# Altium footprint library TH Connectors.PcbLib: 140 footprints (part 8 of 9)
Each footprint in its own frame and in the unit in brackets; x right, y up, seen from the top. Pads: shape width x height; smd on the part's side, far side on the other; paste and mask are expansions set on the pad; w line width, h text height; cw(c..) or ccw(c..) is an arc to the next point about the centre after c.
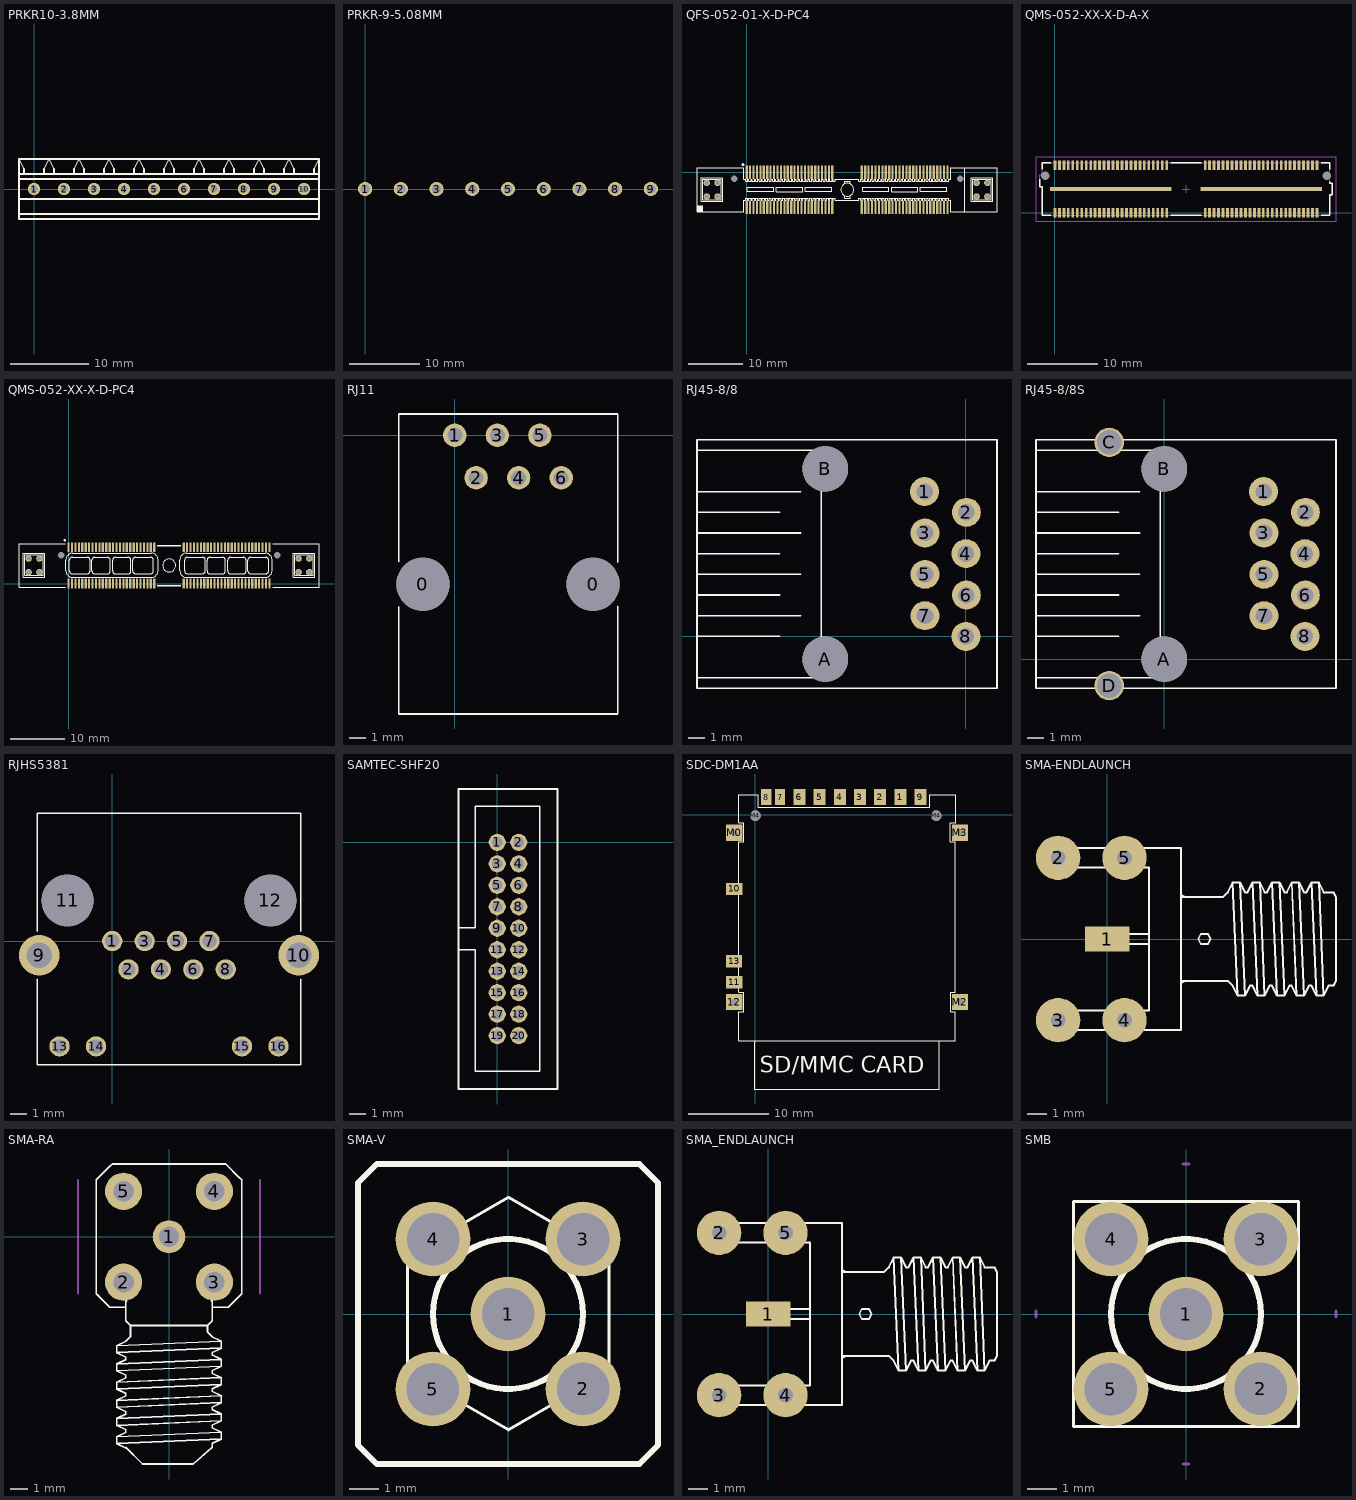
[diagram p7: the footprints below, top view; thin cyan lines are the x and y axes]

## PRKR10-3.8MM [mil]
pads (10):
  round 62 hole 35: 1(0,0) 2(150,0) 3(300,0) 4(450,0) 5(600,0) 6(750,0) 7(900,0) 8(1050,0) 9(1200,0) 10(1350,0)
Top Overlay:
  lines w8: -75,-125 1425,-125 ; -75,-50 1425,-50 ; -75,50 1425,50 ; -75,75 1425,75 ; -50,75 -50,100 -75,150 ; 50,75 50,100 75,150 100,100 100,75 ; 200,75 200,100 225,150 250,100 250,75 ; 350,75 350,100 375,150 400,100 400,75 ; 500,75 500,100 525,150 550,100 550,75 ; 650,75 650,100 675,150 700,100 700,75 ; 800,75 800,100 825,150 850,100 850,75 ; 950,75 950,100 975,150 1000,100 1000,75 ; 1100,75 1100,100 1125,150 1150,100 1150,75 ; 1250,75 1250,100 1275,150 1300,100 1300,75 ; 1400,75 1400,100 1425,150 ; -75,150 1425,150 ; -75,150 -75,-150 1425,-150 1425,150
3D body: height 349.65, standoff -122.8, extent -74,-144.4 1426,143

## PRKR-9-5.08MM [mil]
pads (9):
  round 80 hole 50 unplated mask+2: 1(0,0) 2(200,0) 3(400,0) 4(600,0) 5(800,0) 6(1000,0) 7(1200,0) 8(1400,0) 9(1600,0)
3D body: height 598.43, standoff -137.8, extent -100,-177.16 1719.69,177.16
3D body: height 0, standoff 0, extent -42,-42 1642,42

## QFS-052-01-X-D-PC4 [mm]
pads (114):
  rect 0.4x2.55 smd paste-0.508: 1(0,0) 2(0,-6.48) 3(0.635,0) 4(0.635,-6.48) 5(1.27,0) 6(1.27,-6.48) 7(1.905,0) 8(1.905,-6.48) 9(2.54,0) 10(2.54,-6.48) 11(3.175,0) 12(3.175,-6.48) 13(3.81,0) 14(3.81,-6.48) 15(4.445,0) 16(4.445,-6.48) 17(5.08,0) 18(5.08,-6.48) 19(5.715,0) 20(5.715,-6.48) 21(6.35,0) 22(6.35,-6.48) 23(6.985,0) 24(6.985,-6.48) 25(7.62,0) 26(7.62,-6.48) 27(8.255,0) 28(8.255,-6.48) 29(8.89,0) 30(8.89,-6.48) 31(9.525,0) 32(9.525,-6.48) 33(10.16,0) 34(10.16,-6.48) 35(10.795,0) 36(10.795,-6.48) 37(11.43,0) 38(11.43,-6.48) 39(12.065,0) 40(12.065,-6.48) 41(12.7,0) 42(12.7,-6.48) 43(13.335,0) 44(13.335,-6.48) 45(13.97,0) 46(13.97,-6.48) 47(14.605,0) 48(14.605,-6.48) 49(15.24,0) 50(15.24,-6.48) 51(15.875,0) 52(15.875,-6.48) 53(21.34,0) 54(21.34,-6.48) 55(21.975,0) 56(21.975,-6.48) 57(22.61,0) 58(22.61,-6.48) 59(23.245,0) 60(23.245,-6.48) 61(23.88,0) 62(23.88,-6.48) 63(24.515,0) 64(24.515,-6.48) 65(25.15,0) 66(25.15,-6.48) 67(25.785,0) 68(25.785,-6.48) 69(26.42,0) 70(26.42,-6.48) 71(27.055,0) 72(27.055,-6.48) 73(27.69,0) 74(27.69,-6.48) 75(28.325,0) 76(28.325,-6.48) 77(28.96,0) 78(28.96,-6.48) 79(29.595,0) 80(29.595,-6.48) 81(30.23,0) 82(30.23,-6.48) 83(30.865,0) 84(30.865,-6.48) 85(31.5,0) 86(31.5,-6.48) 87(32.135,0) 88(32.135,-6.48) 89(32.77,0) 90(32.77,-6.48) 91(33.405,0) 92(33.405,-6.48) 93(34.04,0) 94(34.04,-6.48) 95(34.675,0) 96(34.675,-6.48) 97(35.31,0) 98(35.31,-6.48) 99(35.945,0) 100(35.945,-6.48) 101(36.58,0) 102(36.58,-6.48) 103(37.215,0) 104(37.215,-6.48)
  round 1 hole 1.2 unplated paste-0.508: M1(39.56,-1.21) M2(-2.34,-1.21)
  round 1.2 hole 0.8 paste-0.508: P1(-7.4,-1.97) P2(-5.4,-1.97) P3(-7.4,-4.51) P4(-5.4,-4.51) P5(42.615,-1.97) P6(44.615,-1.97) P7(42.615,-4.51) P8(44.615,-4.51)
Top Overlay:
  drawing of 508 lines, arcs and shapes, not listed
3D body: height 8.85, standoff -1.77, extent -9.131,-7.316 46.418,0.813

## QMS-052-XX-X-D-A-X [mm]
pads (108):
  rect 0.4x1.4 smd: 1(0,0) 2(0,6.73) 3(0.635,0) 4(0.635,6.73) 5(1.27,0) 6(1.27,6.73) 7(1.905,0) 8(1.905,6.73) 9(2.54,0) 10(2.54,6.73) 11(3.175,0) 12(3.175,6.73) 13(3.81,0) 14(3.81,6.73) 15(4.445,0) 16(4.445,6.73) 17(5.08,0) 18(5.08,6.73) 19(5.715,0) 20(5.715,6.73) 21(6.35,0) 22(6.35,6.73) 23(6.985,0) 24(6.985,6.73) 25(7.62,0) 26(7.62,6.73) 27(8.255,0) 28(8.255,6.73) 29(8.89,0) 30(8.89,6.73) 31(9.525,0) 32(9.525,6.73) 33(10.16,0) 34(10.16,6.73) 35(10.795,0) 36(10.795,6.73) 37(11.43,0) 38(11.43,6.73) 39(12.065,0) 40(12.065,6.73) 41(12.7,0) 42(12.7,6.73) 43(13.335,0) 44(13.335,6.73) 45(13.97,0) 46(13.97,6.73) 47(14.605,0) 48(14.605,6.73) 49(15.24,0) 50(15.24,6.73) 51(15.875,0) 52(15.875,6.73) 53(21.34,0) 54(21.34,6.73) 55(21.975,0) 56(21.975,6.73) 57(22.61,0) 58(22.61,6.73) 59(23.245,0) 60(23.245,6.73) 61(23.88,0) 62(23.88,6.73) 63(24.515,0) 64(24.515,6.73) 65(25.15,0) 66(25.15,6.73) 67(25.785,0) 68(25.785,6.73) 69(26.42,0) 70(26.42,6.73) 71(27.055,0) 72(27.055,6.73) 73(27.69,0) 74(27.69,6.73) 75(28.325,0) 76(28.325,6.73) 77(28.96,0) 78(28.96,6.73) 79(29.595,0) 80(29.595,6.73) 81(30.23,0) 82(30.23,6.73) 83(30.865,0) 84(30.865,6.73) 85(31.5,0) 86(31.5,6.73) 87(32.135,0) 88(32.135,6.73) 89(32.77,0) 90(32.77,6.73) 91(33.405,0) 92(33.405,6.73) 93(34.04,0) 94(34.04,6.73) 95(34.675,0) 96(34.675,6.73) 97(35.31,0) 98(35.31,6.73) 99(35.945,0) 100(35.945,6.73) 101(36.58,0) 102(36.58,6.73) 103(37.215,0) 104(37.215,6.73)
  rect 17.25x0.5 smd: 105(7.94,3.365) 106(29.28,3.365)
  round 1 hole 1.2 unplated: 107(-1.395,5.275) 108(38.627,5.275)
Top Overlay:
  lines w0.2: -2.184,4.715 -2.184,3.715 -1.784,3.715 -1.784,-0.385 -0.584,-0.385 ; -1.784,6.165 -1.784,7.115 -0.584,7.115 ; 16.466,-0.385 20.766,-0.385 ; 16.466,7.115 20.766,7.115 ; 37.816,-0.385 39.016,-0.385 39.016,2.515 39.416,2.515 39.416,4.165 39.016,4.165 39.016,4.365 ; 37.816,7.115 39.016,7.115 39.016,6.165
Mechanical 12:
  lines w0.001: -2.184,3.715 -1.784,3.715 -1.784,-0.385 39.016,-0.385 39.016,2.515 39.416,2.515 39.416,4.165 39.016,4.165 39.016,7.115 -1.784,7.115 -1.784,5.365 -2.184,5.365 -2.184,3.715
Mechanical 13:
  lines w0.1: -2.184,3.715 -1.784,3.715 -1.784,-0.385 39.016,-0.385 39.016,2.515 39.416,2.515 39.416,4.165 39.016,4.165 39.016,7.115 -1.784,7.115 -1.784,5.365 -2.184,5.365 -2.184,3.715
Mechanical 15:
  lines w0.05: 18.116,3.365 19.116,3.365 ; 18.616,2.865 18.616,3.865 ; -2.684,-1.185 39.916,-1.185 39.916,7.915 -2.684,7.915 -2.684,-1.185

## QMS-052-XX-X-D-PC4 [mm]
pads (114):
  rect 0.4x1.8 smd: 1(0,0) 2(0,6.73) 3(0.635,0) 4(0.635,6.73) 5(1.27,0) 6(1.27,6.73) 7(1.905,0) 8(1.905,6.73) 9(2.54,0) 10(2.54,6.73) 11(3.175,0) 12(3.175,6.73) 13(3.81,0) 14(3.81,6.73) 15(4.445,0) 16(4.445,6.73) 17(5.08,0) 18(5.08,6.73) 19(5.715,0) 20(5.715,6.73) 21(6.35,0) 22(6.35,6.73) 23(6.985,0) 24(6.985,6.73) 25(7.62,0) 26(7.62,6.73) 27(8.255,0) 28(8.255,6.73) 29(8.89,0) 30(8.89,6.73) 31(9.525,0) 32(9.525,6.73) 33(10.16,0) 34(10.16,6.73) 35(10.795,0) 36(10.795,6.73) 37(11.43,0) 38(11.43,6.73) 39(12.065,0) 40(12.065,6.73) 41(12.7,0) 42(12.7,6.73) 43(13.335,0) 44(13.335,6.73) 45(13.97,0) 46(13.97,6.73) 47(14.605,0) 48(14.605,6.73) 49(15.24,0) 50(15.24,6.73) 51(15.875,0) 52(15.875,6.73) 53(21.34,0) 54(21.34,6.73) 55(21.975,0) 56(21.975,6.73) 57(22.61,0) 58(22.61,6.73) 59(23.245,0) 60(23.245,6.73) 61(23.88,0) 62(23.88,6.73) 63(24.515,0) 64(24.515,6.73) 65(25.15,0) 66(25.15,6.73) 67(25.785,0) 68(25.785,6.73) 69(26.42,0) 70(26.42,6.73) 71(27.055,0) 72(27.055,6.73) 73(27.69,0) 74(27.69,6.73) 75(28.325,0) 76(28.325,6.73) 77(28.96,0) 78(28.96,6.73) 79(29.595,0) 80(29.595,6.73) 81(30.23,0) 82(30.23,6.73) 83(30.865,0) 84(30.865,6.73) 85(31.5,0) 86(31.5,6.73) 87(32.135,0) 88(32.135,6.73) 89(32.77,0) 90(32.77,6.73) 91(33.405,0) 92(33.405,6.73) 93(34.04,0) 94(34.04,6.73) 95(34.675,0) 96(34.675,6.73) 97(35.31,0) 98(35.31,6.73) 99(35.945,0) 100(35.945,6.73) 101(36.58,0) 102(36.58,6.73) 103(37.215,0) 104(37.215,6.73)
  round 1 hole 1.2: 107(-1.395,5.275) 108(38.627,5.275)
  round 1.2 hole 0.8: P1(-7.4,4.63) P2(-5.4,4.63) P3(-7.4,2.09) P4(-5.4,2.09) P5(42.615,4.63) P6(44.615,4.63) P7(42.615,2.09) P8(44.615,2.09)
Top Overlay:
  drawing of 172 lines, arcs and shapes, not listed
3D body: height 6.58, standoff -2.82, extent -9.309,-0.406 46.571,7.112

## RJ11 [mil]
pads (8):
  round 125 hole 125 unplated: 0(-75,-350) 0(325,-350)
  round 55 hole 35: 1(0,0) 2(50,-100) 3(100,0) 4(150,-100) 5(200,0) 6(250,-100)
Top Overlay:
  lines w4: -132,-403 -132,-655 383,-655 383,-402 ; -132,-297 -132,50 383,50 383,-298

## RJ45-8/8 [mil]
pads (10):
  round 70 hole 40: 1(-100,350) 2(1,300) 3(-99,250) 4(0,200) 5(-99,150) 6(1,100) 7(-99,50) 8(0,0)
  round 110 hole 110 unplated: A(-340,-55) B(-340,405)
Top Overlay:
  lines w4: -650,-100 -400,-100 -350,-100 -350,450 -650,450 ; -650,0 -450,0 ; -650,50 -400,50 ; -650,100 -450,100 ; -650,150 -400,150 ; -650,200 -450,200 ; -650,250 -400,250 ; -650,300 -450,300 ; -650,350 -400,350 ; -100,475 75,475 ; 75,75 75,475 ; 75,475 75,-125 -650,-125 -650,475 75,475

## RJ45-8/8S [mil]
pads (12):
  round 70 hole 40: 1(240,405) 2(341,355) 3(241,305) 4(340,255) 5(241,205) 6(341,155) 7(241,105) 8(340,55)
  round 110 hole 110 unplated: A(0,0) B(0,460)
  round 70.87 hole 59.05: C(-133,524) D(-133,-64)
Top Overlay:
  lines w4: -310,-45 -60,-45 -10,-45 -10,505 -310,505 ; -310,55 -110,55 ; -310,105 -60,105 ; -310,155 -110,155 ; -310,205 -60,205 ; -310,255 -110,255 ; -310,305 -60,305 ; -310,355 -110,355 ; -310,405 -60,405 ; 240,530 415,530 ; 415,130 415,530 ; 415,530 -310,530 -310,-70 415,-70 415,530

## RJHS5381 [mil]
pads (16):
  round 50 hole 35: 1(0,0) 2(40,-70) 3(80,0) 4(120,-70) 5(160,0) 6(200,-70) 7(240,0) 8(280,-70) 13(-130,-260) 14(-40,-260) 15(320,-260) 16(410,-260)
  round 100 hole 62: 9(-180,-35) 10(460,-35)
  round 128 hole 128 unplated: 11(-110,100) 12(390,100)
Top Overlay:
  lines w4: -185,-94 -185,-305 465,-305 465,-94 ; -185,24 -185,315 465,315 465,24

## SAMTEC-SHF20 [mil]
pads (20):
  round 40 hole 25: 1(0,0) 2(50,0) 3(0,-50) 4(50,-50) 5(0,-100) 6(50,-100) 7(0,-150) 8(50,-150) 9(0,-200) 10(50,-200) 11(0,-250) 12(50,-250) 13(0,-300) 14(50,-300) 15(0,-350) 16(50,-350) 17(0,-400) 18(50,-400) 19(0,-450) 20(50,-450)
Top Overlay:
  lines w4: -89,-250 -51,-250 -51,-533 99,-533 99,84 -51,84 -51,-199 -88,-199 ; -90,-574 -90,-79 -90,124 0,124 140,124 140,-371 140,-574 50,-574 -90,-574

## SDC-DM1AA [mm]
pads (18):
  rect 1.5x2 smd: 1(17.995,2.224) 2(15.471,2.224) 3(12.972,2.224) 4(10.472,2.224) 5(7.973,2.224) 6(5.449,2.224) 9(20.47,2.224)
  rect 1.3x2 smd: 7(3.049,2.224) 8(1.325,2.224)
  rect 2x1.5 smd: 10(-2.624,-9.173) 11(-2.624,-20.745) 13(-2.649,-18.145)
  rect 2x2 hole 0.762: 12(-2.624,-23.219) M0(-2.624,-2.199) M2(25.368,-23.219) M3(25.368,-2.199)
  round 1.3 on Top hole 1.3 unplated: M4(0,-0.075) M4(22.419,-0.075)
Top Overlay:
  lines w0.102: -0.075,-27.993 -0.075,-33.991 16.546,-33.991 ; 6.198,-33.991 22.819,-33.991 22.819,-27.993 ; 20.895,-27.993 24.819,-27.993 24.819,-24.394 24.219,-24.394 24.219,-22.019 24.819,-22.019 24.819,-3.299 24.169,-3.299 24.169,-1.775 24.169,-0.95 24.394,-0.95 24.844,-0.95 24.844,2.524 21.594,2.524 21.594,0.975 0.325,0.975 0.325,2.524 -0.05,2.524 ; 21.12,-27.993 -2.074,-27.993 -2.074,-24.394 -1.475,-24.394 -1.475,-22.019 -2.074,-22.019 -2.074,-3.299 -1.425,-3.299 -1.425,-1.775 -1.425,-0.95 -1.65,-0.95 -2.099,-0.95 -2.099,2.524 ; -2.099,2.524 -0.05,2.524 ; -2.099,2.524 -0.05,2.524
  text "SD/MMC CARD" at 0.525,-31.967 h2.03

## SMA-ENDLAUNCH [mil]
pads (5):
  rect 90x50 smd: 1(0,0)
  round 90 hole 30: 2(-100,165) 3(-100,-165) 4(35,-165) 5(35,165)
Top Overlay:
  lines w4: 10,-10 85,-10 ; 10,10 85,10 ; 150,-90 160,-85 ; 150,-85 200,-85 220,-85 225,-85 235,-85 245,-85 255,-95 265,-115 ; 150,85 200,85 220,85 225,85 235,85 245,95 255,115 ; 150,90 160,85 ; 255,115 270,115 ; 255,115 265,-115 ; 265,-115 280,-115 ; 270,115 280,95 285,95 ; 270,115 280,-115 ; 280,-115 290,-95 ; 285,95 295,115 ; 285,95 295,115 ; 290,-95 295,-95 ; 290,-95 295,-95 ; 295,-95 305,-115 ; 295,115 310,115 ; 295,115 305,-115 ; 305,-115 320,-115 ; 310,115 320,95 325,95 335,115 ; 310,115 320,-115 ; 320,-115 330,-95 335,-95 345,-115 ; 335,115 350,115 ; 335,115 345,-115 ; 345,-115 360,-115 ; 350,115 360,95 365,95 375,115 ; 350,115 360,-115 ; 360,-115 370,-95 375,-95 385,-115 ; 375,115 390,115 ; 375,115 385,-115 ; 385,-115 400,-115 ; 390,115 400,95 405,95 415,115 ; 390,115 400,-115 ; 400,-115 410,-95 415,-95 425,-115 ; 415,115 430,115 ; 415,115 425,-115 ; 425,-115 440,-115 ; 430,115 440,95 448.33,95 460,95 465,85 465,53.33 465,-58.33 465,-85 460,-95 450,-95 440,-115 ; 430,115 440,-115 ; -100,-185 -100,-145 85,-145 85,145 -100,145 -100,185 65,185 85,185 150,185 150,-185 -100,-185 ; 185,0 190,10 205,10 210,0 205,-10 190,-10 185,0
3D body: height 140, standoff -110, extent -126.5,-120 470.5,130

## SMA-RA [mil]
pads (5):
  round 72 hole 45: 1(0,0)
  round 82 hole 45: 2(-100,-100) 3(100,-100) 4(100,100) 5(-100,100)
Top Overlay:
  lines w4: -155,-130 -160,-125 ; -95,-465 -115,-455 ; -95,-463.33 -58.33,-500 53.33,-500 95,-463.33 95,-455 115,-445 ; -95,-155 -130,-155 -160,-125 ; -93.33,-141.67 -95,-140 -95,-185 -85,-195 ; 93.33,-141.67 95,-140 95,-185 85,-195 ; 95,-155 130,-155 160,-125 160,80 ; 160,75 160,125 155,130 125,160 -125,160 -130,155 -160,125 -160,-125 ; -115,-455 -115,-440 ; -115,-455 115,-445 ; -115,-440 -95,-430 -95,-425 -115,-415 ; -115,-440 115,-430 ; -115,-415 -115,-400 ; -115,-415 115,-405 ; -115,-400 -95,-390 -95,-385 -115,-375 ; -115,-400 115,-390 ; -115,-375 -115,-360 ; -115,-375 115,-365 ; -115,-360 -95,-350 -95,-345 -115,-335 ; -115,-360 115,-350 ; -115,-335 -115,-320 ; -115,-335 115,-325 ; -115,-320 -95,-310 -95,-305 -115,-295 ; -115,-320 115,-310 ; -115,-295 -115,-280 ; -115,-295 115,-285 ; -115,-280 -95,-270 -95,-265 -115,-255 ; -115,-280 115,-270 ; -115,-255 -115,-240 ; -115,-255 115,-245 ; -115,-240 -95,-230 -85,-220 -85,-210 -85,-200 -85,-195 ; -115,-240 115,-230 ; -85,-195 85,-195 ; 85,-195 85,-200 85,-210 95,-220 115,-230 ; 115,-445 115,-430 ; 115,-430 95,-420 95,-415 115,-405 ; 115,-405 115,-390 ; 115,-390 95,-380 95,-375 115,-365 ; 115,-365 115,-350 ; 115,-350 95,-340 95,-335 115,-325 ; 115,-325 115,-310 ; 115,-310 95,-300 95,-295 115,-285 ; 115,-285 115,-270 ; 115,-270 95,-260 95,-255 115,-245 ; 115,-245 115,-230
Mechanical 1:
  lines w4: -200,-125 -200,125 ; 200,-125 200,125
3D body: height 394.06, standoff -149.25, extent -136.5,-457.49 139.09,137

## SMA-V [mil]
pads (5):
  round 100 hole 70: 1(0,0) 2(100,-100) 3(100,100) 4(-100,100) 5(-100,-100)
Top Overlay:
  circle w8: c0,0 r25
  circle w8: c0,0 r100
  lines w4: -133.69,-76.91 0.55,-154.41 134.78,-76.91 134.78,78.09 0.55,155.59 -133.69,78.09 -133.69,-76.91
  lines w8: -200,-175 -200,150 -200,175 -175,200 175,200 200,175 200,-175 175,-200 -175,-200 -200,-175
3D body: height 385.54, standoff -145.95, extent -138.3,-136.09 137.3,139.5

## SMA_ENDLAUNCH [mil]
pads (5):
  rect 90x50 smd: 1(0,0)
  round 90 hole 30: 2(-100,165) 3(-100,-165) 4(35,-165) 5(35,165)
Top Overlay:
  lines w4: 10,-10 85,-10 ; 10,10 85,10 ; 150,-90 160,-85 ; 150,-85 200,-85 220,-85 225,-85 235,-85 245,-85 255,-95 265,-115 ; 150,85 200,85 220,85 225,85 235,85 245,95 255,115 ; 150,90 160,85 ; 255,115 270,115 ; 255,115 265,-115 ; 265,-115 280,-115 ; 270,115 280,95 285,95 ; 270,115 280,-115 ; 280,-115 290,-95 ; 285,95 295,115 ; 285,95 295,115 ; 290,-95 295,-95 ; 290,-95 295,-95 ; 295,-95 305,-115 ; 295,115 310,115 ; 295,115 305,-115 ; 305,-115 320,-115 ; 310,115 320,95 325,95 335,115 ; 310,115 320,-115 ; 320,-115 330,-95 335,-95 345,-115 ; 335,115 350,115 ; 335,115 345,-115 ; 345,-115 360,-115 ; 350,115 360,95 365,95 375,115 ; 350,115 360,-115 ; 360,-115 370,-95 375,-95 385,-115 ; 375,115 390,115 ; 375,115 385,-115 ; 385,-115 400,-115 ; 390,115 400,95 405,95 415,115 ; 390,115 400,-115 ; 400,-115 410,-95 415,-95 425,-115 ; 415,115 430,115 ; 415,115 425,-115 ; 425,-115 440,-115 ; 430,115 440,95 448.33,95 460,95 465,85 465,53.33 465,-58.33 465,-85 460,-95 450,-95 440,-115 ; 430,115 440,-115 ; -100,-185 -100,-145 85,-145 85,145 -100,145 -100,185 65,185 85,185 150,185 150,-185 -100,-185 ; 185,0 190,10 205,10 210,0 205,-10 190,-10 185,0
3D body: height 155.91, standoff -155.91, extent -103.24,-186 441.24,188.8

## SMB [mil]
pads (5):
  round 100 hole 70: 1(0,0) 2(100,-100) 3(100,100) 4(-100,100) 5(-100,-100)
Top Overlay:
  circle w8: c0,0 r25
  circle w8: c0,0 r100
  lines w4: -150,-150 -150,150 150,150 150,-150 -150,-150
Mechanical 1:
  lines w4: -200,-4 -200,0 -200,4 ; -4,-200 0,-200 4,-200 ; -4,200 0,200 4,200 ; 200,-4 200,0 200,4